# Altium footprint library RNG_Footprints.PcbLib: 134 footprints (part 1 of 9)
Each footprint in its own frame and in the unit in brackets; x right, y up, seen from the top. Pads: shape width x height; smd on the part's side, far side on the other; paste and mask are expansions set on the pad; w line width, h text height; cw(c..) or ccw(c..) is an arc to the next point about the centre after c.
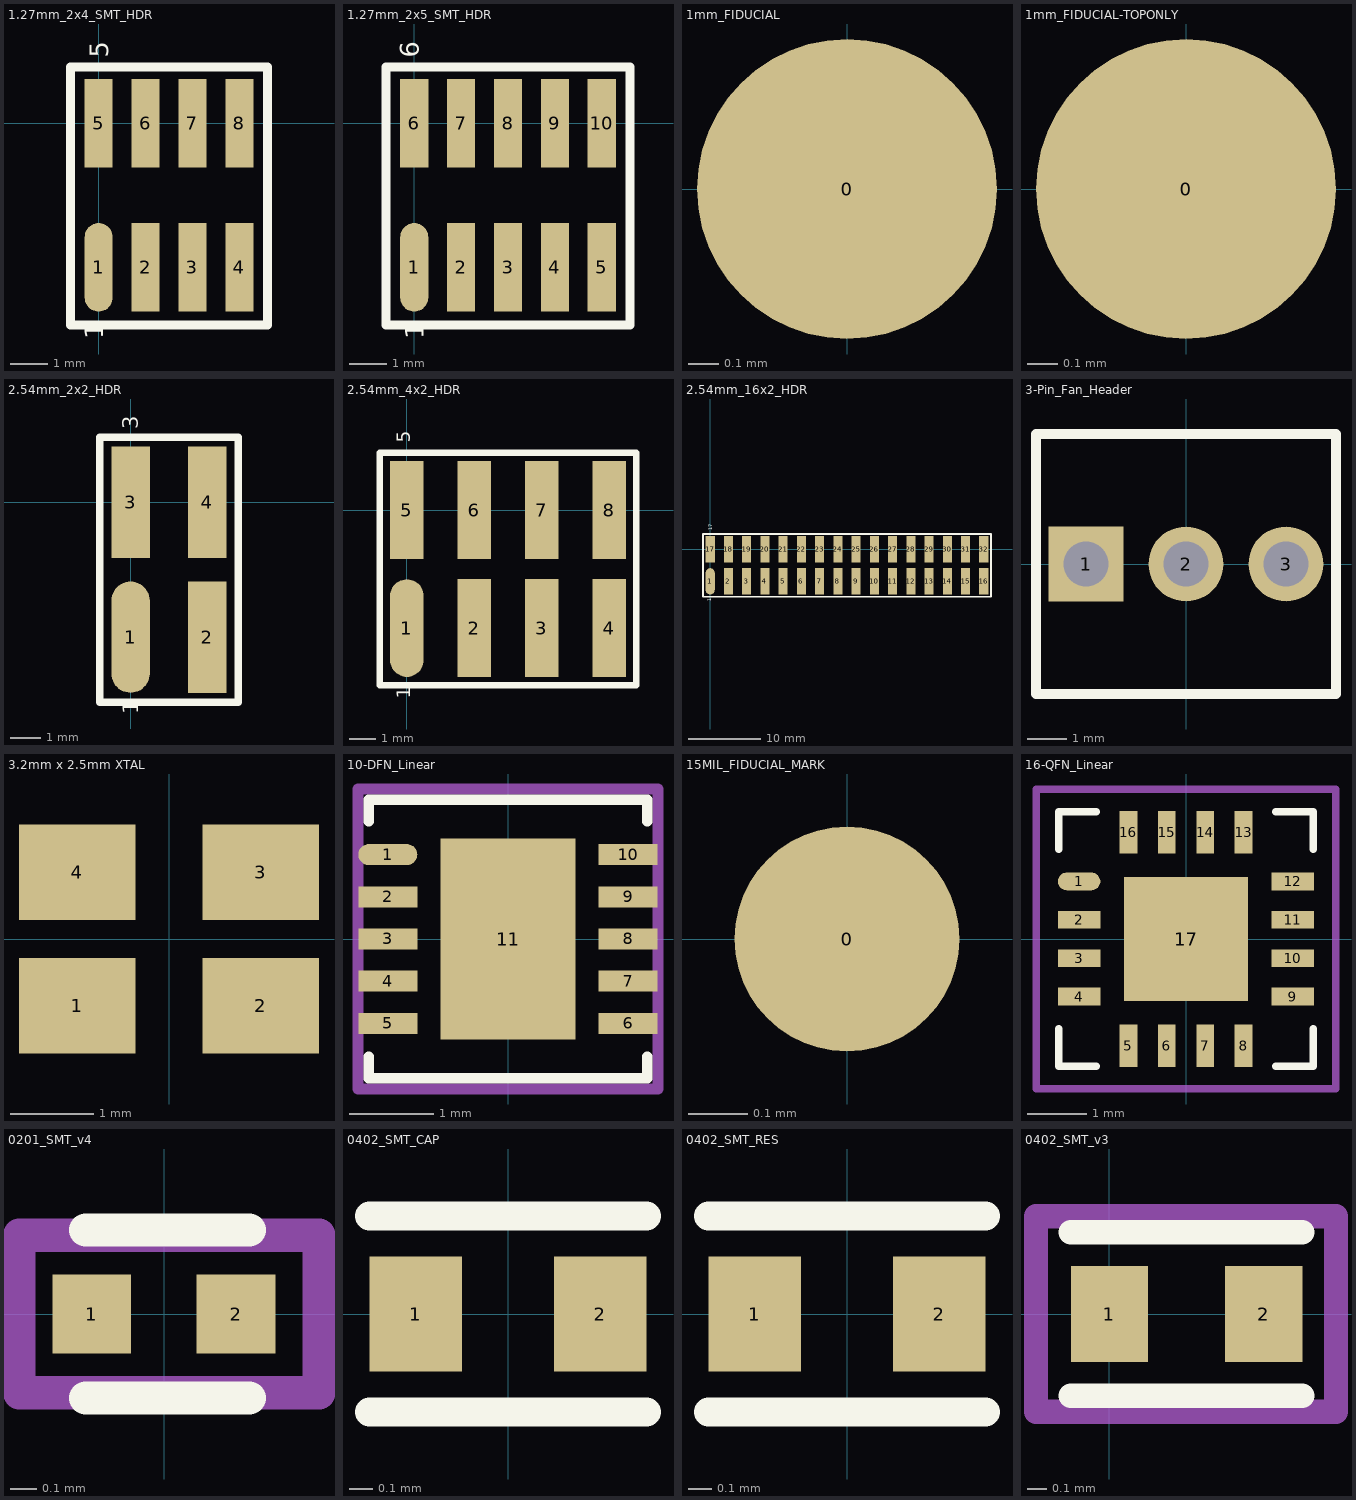
[diagram p0: the footprints below, top view; thin cyan lines are the x and y axes]

## 1.27mm_2x4_SMT_HDR [mm] "2x4 SMT Pin Header, 1.27mm Pitch"
pads (8):
  oval 0.76x2.4 smd: 1(0,-3.9)
  rect 0.76x2.4 smd: 2(1.27,-3.9) 3(2.54,-3.9) 4(3.81,-3.9) 5(0,0) 6(1.27,0) 7(2.54,0) 8(3.81,0)
Top Overlay:
  lines w0.25: -0.762,-5.461 -0.762,1.524 4.572,1.524 4.572,-5.461 -0.762,-5.461
  text "1" at 0.127,-5.842 h0.51
  text "5" at 0.254,1.778 h0.51

## 1.27mm_2x5_SMT_HDR [mm] "2x5 SMT Pin Header, 1.27mm Pitch"
pads (10):
  oval 0.76x2.4 smd: 1(0,-3.9)
  rect 0.76x2.4 smd: 2(1.27,-3.9) 3(2.54,-3.9) 4(3.81,-3.9) 5(5.08,-3.9) 6(0,0) 7(1.27,0) 8(2.54,0) 9(3.81,0) 10(5.08,0)
Top Overlay:
  lines w0.25: -0.762,-5.461 5.842,-5.461 5.842,1.524 -0.762,1.524 -0.762,-5.461
  text "6" at 0.127,1.778 h0.51
  text "1" at 0.254,-5.842 h0.51

## 1mm_FIDUCIAL [mm] "Fiducial Mark"
pads (1):
  round 1 all layers, no hole paste-0.5 mask+0.6: 0(0,0)

## 1mm_FIDUCIAL-TOPONLY [mm] "Fiducial Mark"
pads (1):
  round 1 smd paste-0.5 mask+0.6: 0(0,0)

## 2.54mm_2x2_HDR [mm] "2x2 SMT Pin Header, 2.54mm Pitch"
pads (4):
  oval 1.27x3.68 smd: 1(0,-4.445)
  rect 1.27x3.68 smd: 2(2.54,-4.445) 3(0,0) 4(2.54,0)
Top Overlay:
  lines w0.25: -1.016,-6.604 -1.016,2.159 3.556,2.159 3.556,-6.604 -1.016,-6.604
  text "1" at 0.254,-6.985 h0.51
  text "3" at 0.254,2.413 h0.51

## 2.54mm_4x2_HDR [mm] "4x2 SMT Pin Header, 2.54mm Pitch"
pads (8):
  oval 1.27x3.68 smd: 1(0,-4.445)
  rect 1.27x3.68 smd: 2(2.54,-4.445) 3(5.08,-4.445) 4(7.62,-4.445) 5(0,0) 6(2.54,0) 7(5.08,0) 8(7.62,0)
Top Overlay:
  lines w0.25: -1.016,-6.604 -1.016,2.159 8.636,2.159 8.636,-6.604 -1.016,-6.604
  text "1" at 0.127,-7.112 h0.51
  text "5" at 0.127,2.54 h0.51

## 2.54mm_16x2_HDR [mm] "16x2 SMT Pin Header, 2.54mm Pitch"
pads (32):
  oval 1.27x3.68 smd: 1(0,-4.445)
  rect 1.27x3.68 smd: 2(2.54,-4.445) 3(5.08,-4.445) 4(7.62,-4.445) 5(10.16,-4.445) 6(12.7,-4.445) 7(15.24,-4.445) 8(17.78,-4.445) 9(20.32,-4.445) 10(22.86,-4.445) 11(25.4,-4.445) 12(27.94,-4.445) 13(30.48,-4.445) 14(33.02,-4.445) 15(35.56,-4.445) 16(38.1,-4.445) 17(0,0) 18(2.54,0) 19(5.08,0) 20(7.62,0) 21(10.16,0) 22(12.7,0) 23(15.24,0) 24(17.78,0) 25(20.32,0) 26(22.86,0) 27(25.4,0) 28(27.94,0) 29(30.48,0) 30(33.02,0) 31(35.56,0) 32(38.1,0)
Top Overlay:
  lines w0.25: -1.016,-6.604 -1.016,2.159 39.116,2.159 39.116,-6.604 -1.016,-6.604
  text "17" at 0.254,2.667 h0.51
  text "1" at 0.127,-7.239 h0.51

## 3-Pin_Fan_Header [mil] "Molex KK 2.54mm 3-Pin Fan Header"
height 474.02
pads (3):
  rect 75x75 hole 45: 1(-100,0)
  round 75 hole 45: 2(0,0) 3(100,0)
Top Overlay:
  lines w10: -150,-130 150,-130 150,130 -150,130 -150,-130
3D body "1718561003.stp": height 418.48, standoff -91.52, extent -147,-125 147,125

## 3.2mm x 2.5mm XTAL [mm] "3.2mm x 2.5mm XTAL"
height 0.6
pads (4):
  rect 1.4x1.15 smd: 1(-1.1,-0.8) 2(1.1,-0.8) 3(1.1,0.8) 4(-1.1,0.8)
3D body "User Library-tsx-3225.STEP": height 0.6, standoff 0, extent -1.6,-1.27 1.6,1.23

## 10-DFN_Linear [mm]
pads (11):
  oval 0.7x0.25 smd: 1(-1.425,1)
  rect 0.7x0.25 smd: 2(-1.425,0.5) 3(-1.425,0) 4(-1.425,-0.5) 5(-1.425,-1) 6(1.425,-1) 7(1.425,-0.5) 8(1.425,0) 9(1.425,0.5) 10(1.425,1)
  rect 1.6x2.38 smd paste-1.19: 11(0,0)
Top Overlay:
  lines w0.127: -1.651,-1.397 -1.651,-1.651 1.651,-1.651 1.651,-1.397 ; -1.651,1.397 -1.651,1.651 1.651,1.651 1.651,1.397
Top Paste:
  rectangle: 0.09,-1.143 0.762,-0.09
  rectangle: -0.762,-1.143 -0.09,-0.09
  rectangle: 0.09,0.09 0.762,1.143
  rectangle: -0.762,0.09 -0.09,1.143
Mechanical 15:
  lines w0.127: -0.254,0 0.254,0 ; 0,-0.254 0,0.254 ; -1.778,-1.778 -1.778,1.778 1.778,1.778 1.778,-1.778 -1.778,-1.778
3D body: height 0.8, standoff 0.03, extent -1.5,-1.5 1.5,1.5

## 15MIL_FIDUCIAL_MARK [mil]
pads (1):
  round 15 all layers, no hole paste+7.5 mask+8: 0(0,0)

## 16-QFN_Linear [mm]
pads (17):
  oval 0.72x0.3 smd: 1(-1.81,0.975)
  rect 0.72x0.3 smd: 2(-1.81,0.325) 3(-1.81,-0.325) 4(-1.81,-0.975) 9(1.81,-0.975) 10(1.81,-0.325) 11(1.81,0.325) 12(1.81,0.975)
  rect 0.3x0.72 smd: 5(-0.975,-1.81) 6(-0.325,-1.81) 7(0.325,-1.81) 8(0.975,-1.81) 13(0.975,1.81) 14(0.325,1.81) 15(-0.325,1.81) 16(-0.975,1.81)
  rect 2.1x2.1 smd: 17(0,0)
Top Overlay:
  lines w0.127: -2.159,-1.524 -2.159,-2.159 -1.524,-2.159 ; -2.159,1.524 -2.159,2.159 -1.524,2.159 ; 1.524,-2.159 2.159,-2.159 2.159,-1.524 ; 1.524,2.159 2.159,2.159 2.159,1.524
  text "." at -2.159,1.841 h2
Mechanical 15:
  lines w0.127: -0.127,0 0.127,0 ; 0,-0.127 0,0.127 ; -2.54,-2.54 -2.54,2.54 2.54,2.54 2.54,-2.54 -2.54,-2.54
3D body: height 0.8, standoff 0.03, extent -2,-2 2,2

## 0201_SMT_v4 [mm] "0201 Chip Cap, Res, Ind"
height 1.6
pads (2):
  rect 0.3x0.3 smd: 1(-0.277,0) 2(0.273,0)
Top Overlay:
  lines w0.127: -0.3,-0.32 0.323,-0.32 ; -0.3,0.32 0.323,0.32
Mechanical 15:
  lines w0.127: -0.554,-0.3 0.589,-0.3 0.589,0.3 -0.554,0.3 -0.554,-0.3
3D body: height 0.25, standoff 0, extent -0.3,-0.15 0.3,0.15

## 0402_SMT_CAP [mm] "0402 Chip Cap, Res, Ind"
height 1.6
pads (2):
  rect 0.4x0.5 smd: 1(-0.4,0) 2(0.4,0)
Top Overlay:
  lines w0.127: -0.6,-0.425 0.6,-0.425 ; -0.6,0.425 0.6,0.425
3D body "SW3dPS-0402 SMD Capacitor.STEP": height 0.21, standoff 0.01, extent -0.5,-0.3 0.5,0.3

## 0402_SMT_RES [mm] "0402 Imperial Surface Mount Resistor"
height 1.6
pads (2):
  rect 0.4x0.5 smd: 1(-0.4,0) 2(0.4,0)
Top Overlay:
  lines w0.127: -0.6,-0.425 0.6,-0.425 ; -0.6,0.425 0.6,0.425
3D body "SW3dPS-0402 SMD Resistor.STEP": height 0.21, standoff 0.01, extent -0.508,-0.3 0.492,0.3

## 0402_SMT_v3 [mm] "0402 Chip Cap, Res, Ind"
height 1.6
pads (2):
  rect 0.4x0.5 smd: 1(0,0) 2(0.8,0)
Top Overlay:
  lines w0.127: -0.2,-0.425 1,-0.425 ; -0.2,0.425 1,0.425
Mechanical 15:
  lines w0.127: -0.381,-0.508 1.175,-0.508 1.175,0.508 -0.381,0.508 -0.381,-0.508
3D body: height 0.35, standoff 0, extent -0.1,-0.25 0.9,0.25